# Altium schematic symbol library LDO.SchLib: 2675 symbols (part 23 of 31) (continued)
## LP3990SD-1.2
designator U?
150mA Linear Voltage Regulator for Digital Applications, 6-pin LLP; PartNumber: LP3990SD-1.2; Manufacturer: National Semiconductor; PackageTopMarking: ZXYTT*L086B; PowerWise: N; CompType: LDO IC; High-Reliability: Y; DatasheetVersion: Oct-2005; PackageVersion: revA, Jul-2003; PackageReference: SDE06A; PackageDescription: LLP, Plastic, Dual, 3 x 3 x 0.8mm Body, 6 Lead, 0.95mm Pitch, No Pullback; RoHS: N; PinCount: 6; ComponentLink1Description: Manufacturer URL; ComponentLink1URL: http://www.national.com/; ComponentLink2Description: LP3990 Datasheet; ComponentLink2URL: http://www.national.com/ds/LP/LP3990.pdf; ComponentLink3Description: LP3990 Web Page; ComponentLink3URL: http://www.national.com/pf/LP/LP3990.html; ComponentLink4Description: SDE06A Package Page; ComponentLink4URL: http://www.national.com/packaging/folders/sde06a.html
footprint SDE06A_full (SON, 6-Leads, Body 3x3 mm, Pitch 0.95mm, Full Paste, NSC Recommended)
footprint SDE06A_quad (SON, 6-Leads, Body 3x3 mm, Pitch 0.95mm, Quad Paste, NSC Recommended)
pins: 1 OUT (power), 2 GND (power), 3 NC, 4 NC, 5 EN (in), 6 IN (power), 7 DAP (power)

## LP3990SD-1.2/NOPB
designator U?
150mA Linear Voltage Regulator for Digital Applications, 6-pin LLP, Pb-Free; PartNumber: LP3990SD-1.2/NOPB; Manufacturer: National Semiconductor; PackageTopMarking: ZXYTT*L086B; PowerWise: N; CompType: LDO IC; High-Reliability: Y; DatasheetVersion: Oct-2005; PackageVersion: revA, Jul-2003; PackageReference: SDE06A; PackageDescription: LLP, Plastic, Dual, 3 x 3 x 0.8mm Body, 6 Lead, 0.95mm Pitch, No Pullback; RoHS: Y; PinCount: 6; ComponentLink1Description: Manufacturer URL; ComponentLink1URL: http://www.national.com/; ComponentLink2Description: LP3990 Datasheet; ComponentLink2URL: http://www.national.com/ds/LP/LP3990.pdf; ComponentLink3Description: LP3990 Web Page; ComponentLink3URL: http://www.national.com/pf/LP/LP3990.html; ComponentLink4Description: SDE06A Package Page; ComponentLink4URL: http://www.national.com/packaging/folders/sde06a.html
footprint SDE06A_full (SON, 6-Leads, Body 3x3 mm, Pitch 0.95mm, Full Paste, NSC Recommended)
footprint SDE06A_quad (SON, 6-Leads, Body 3x3 mm, Pitch 0.95mm, Quad Paste, NSC Recommended)
pins: 1 OUT (power), 2 GND (power), 3 NC, 4 NC, 5 EN (in), 6 IN (power), 7 DAP (power)

## LP3990SD-1.5
designator U?
150mA Linear Voltage Regulator for Digital Applications, 6-pin LLP; PartNumber: LP3990SD-1.5; Manufacturer: National Semiconductor; PackageTopMarking: ZXYTT*L087B; PowerWise: N; CompType: LDO IC; High-Reliability: Y; DatasheetVersion: Oct-2005; PackageVersion: revA, Jul-2003; PackageReference: SDE06A; PackageDescription: LLP, Plastic, Dual, 3 x 3 x 0.8mm Body, 6 Lead, 0.95mm Pitch, No Pullback; RoHS: N; PinCount: 6; ComponentLink1Description: Manufacturer URL; ComponentLink1URL: http://www.national.com/; ComponentLink2Description: LP3990 Datasheet; ComponentLink2URL: http://www.national.com/ds/LP/LP3990.pdf; ComponentLink3Description: LP3990 Web Page; ComponentLink3URL: http://www.national.com/pf/LP/LP3990.html; ComponentLink4Description: SDE06A Package Page; ComponentLink4URL: http://www.national.com/packaging/folders/sde06a.html
footprint SDE06A_full (SON, 6-Leads, Body 3x3 mm, Pitch 0.95mm, Full Paste, NSC Recommended)
footprint SDE06A_quad (SON, 6-Leads, Body 3x3 mm, Pitch 0.95mm, Quad Paste, NSC Recommended)
pins: 1 OUT (power), 2 GND (power), 3 NC, 4 NC, 5 EN (in), 6 IN (power), 7 DAP (power)

## LP3990SD-1.5/NOPB
designator U?
150mA Linear Voltage Regulator for Digital Applications, 6-pin LLP, Pb-Free; PartNumber: LP3990SD-1.5/NOPB; Manufacturer: National Semiconductor; PackageTopMarking: ZXYTT*L087B; PowerWise: N; CompType: LDO IC; High-Reliability: Y; DatasheetVersion: Oct-2005; PackageVersion: revA, Jul-2003; PackageReference: SDE06A; PackageDescription: LLP, Plastic, Dual, 3 x 3 x 0.8mm Body, 6 Lead, 0.95mm Pitch, No Pullback; RoHS: Y; PinCount: 6; ComponentLink1Description: Manufacturer URL; ComponentLink1URL: http://www.national.com/; ComponentLink2Description: LP3990 Datasheet; ComponentLink2URL: http://www.national.com/ds/LP/LP3990.pdf; ComponentLink3Description: LP3990 Web Page; ComponentLink3URL: http://www.national.com/pf/LP/LP3990.html; ComponentLink4Description: SDE06A Package Page; ComponentLink4URL: http://www.national.com/packaging/folders/sde06a.html
footprint SDE06A_full (SON, 6-Leads, Body 3x3 mm, Pitch 0.95mm, Full Paste, NSC Recommended)
footprint SDE06A_quad (SON, 6-Leads, Body 3x3 mm, Pitch 0.95mm, Quad Paste, NSC Recommended)
pins: 1 OUT (power), 2 GND (power), 3 NC, 4 NC, 5 EN (in), 6 IN (power), 7 DAP (power)

## LP3990SD-1.8
designator U?
150mA Linear Voltage Regulator for Digital Applications, 6-pin LLP; PartNumber: LP3990SD-1.8; Manufacturer: National Semiconductor; PackageTopMarking: ZXYTT*L088B; PowerWise: N; CompType: LDO IC; High-Reliability: Y; DatasheetVersion: Oct-2005; PackageVersion: revA, Jul-2003; PackageReference: SDE06A; PackageDescription: LLP, Plastic, Dual, 3 x 3 x 0.8mm Body, 6 Lead, 0.95mm Pitch, No Pullback; RoHS: N; PinCount: 6; ComponentLink1Description: Manufacturer URL; ComponentLink1URL: http://www.national.com/; ComponentLink2Description: LP3990 Datasheet; ComponentLink2URL: http://www.national.com/ds/LP/LP3990.pdf; ComponentLink3Description: LP3990 Web Page; ComponentLink3URL: http://www.national.com/pf/LP/LP3990.html; ComponentLink4Description: SDE06A Package Page; ComponentLink4URL: http://www.national.com/packaging/folders/sde06a.html
footprint SDE06A_full (SON, 6-Leads, Body 3x3 mm, Pitch 0.95mm, Full Paste, NSC Recommended)
footprint SDE06A_quad (SON, 6-Leads, Body 3x3 mm, Pitch 0.95mm, Quad Paste, NSC Recommended)
pins: 1 OUT (power), 2 GND (power), 3 NC, 4 NC, 5 EN (in), 6 IN (power), 7 DAP (power)

## LP3990SD-1.8/NOPB
designator U?
150mA Linear Voltage Regulator for Digital Applications, 6-pin LLP, Pb-Free; PartNumber: LP3990SD-1.8/NOPB; Manufacturer: National Semiconductor; PackageTopMarking: ZXYTT*L088B; PowerWise: N; CompType: LDO IC; High-Reliability: Y; DatasheetVersion: Oct-2005; PackageVersion: revA, Jul-2003; PackageReference: SDE06A; PackageDescription: LLP, Plastic, Dual, 3 x 3 x 0.8mm Body, 6 Lead, 0.95mm Pitch, No Pullback; RoHS: Y; PinCount: 6; ComponentLink1Description: Manufacturer URL; ComponentLink1URL: http://www.national.com/; ComponentLink2Description: LP3990 Datasheet; ComponentLink2URL: http://www.national.com/ds/LP/LP3990.pdf; ComponentLink3Description: LP3990 Web Page; ComponentLink3URL: http://www.national.com/pf/LP/LP3990.html; ComponentLink4Description: SDE06A Package Page; ComponentLink4URL: http://www.national.com/packaging/folders/sde06a.html
footprint SDE06A_full (SON, 6-Leads, Body 3x3 mm, Pitch 0.95mm, Full Paste, NSC Recommended)
footprint SDE06A_quad (SON, 6-Leads, Body 3x3 mm, Pitch 0.95mm, Quad Paste, NSC Recommended)
pins: 1 OUT (power), 2 GND (power), 3 NC, 4 NC, 5 EN (in), 6 IN (power), 7 DAP (power)

## LP3990TL-0.8/NOPB
designator U?
150mA Linear Voltage Regulator for Digital Applications, 4-pin Micro SMD, Pb-Free; PartNumber: LP3990TL-0.8/NOPB; Manufacturer: National Semiconductor; PackageTopMarking: X*I; PowerWise: N; CompType: LDO IC; High-Reliability: Y; DatasheetVersion: Oct-2005; PackageVersion: revD, Mar-2005; PackageReference: TLA04AMA; PackageDescription: Thin Micro SMD, 4 Bump (Large), 0.5mm Pitch; RoHS: Y; PinCount: 4; Code_JEDEC: MO-211-BA; ComponentLink1Description: Manufacturer URL; ComponentLink1URL: http://www.national.com/; ComponentLink2Description: LP3990 Datasheet; ComponentLink2URL: http://www.national.com/ds/LP/LP3990.pdf; ComponentLink3Description: LP3990 Web Page; ComponentLink3URL: http://www.national.com/pf/LP/LP3990.html; ComponentLink4Description: TLA04AMA Package Page; ComponentLink4URL: http://www.national.com/packaging/folders/tla04ama.html
footprint TLA04AMA (Micro SMD, 4-Leads, Body 1.29x1.01mm, Pitch 0.5mm, NSC Recommended)
pins: A1 GND (power), A2 EN (in), B1 OUT (power), B2 IN (power)

## LP3990TL-1.2/NOPB
designator U?
150mA Linear Voltage Regulator for Digital Applications, 4-pin Micro SMD, Pb-Free; PartNumber: LP3990TL-1.2/NOPB; Manufacturer: National Semiconductor; PackageTopMarking: X*I; PowerWise: N; CompType: LDO IC; High-Reliability: Y; DatasheetVersion: Oct-2005; PackageVersion: revD, Mar-2005; PackageReference: TLA04AMA; PackageDescription: Thin Micro SMD, 4 Bump (Large), 0.5mm Pitch; RoHS: Y; PinCount: 4; Code_JEDEC: MO-211-BA; ComponentLink1Description: Manufacturer URL; ComponentLink1URL: http://www.national.com/; ComponentLink2Description: LP3990 Datasheet; ComponentLink2URL: http://www.national.com/ds/LP/LP3990.pdf; ComponentLink3Description: LP3990 Web Page; ComponentLink3URL: http://www.national.com/pf/LP/LP3990.html; ComponentLink4Description: TLA04AMA Package Page; ComponentLink4URL: http://www.national.com/packaging/folders/tla04ama.html
footprint TLA04AMA (Micro SMD, 4-Leads, Body 1.29x1.01mm, Pitch 0.5mm, NSC Recommended)
pins: A1 GND (power), A2 EN (in), B1 OUT (power), B2 IN (power)

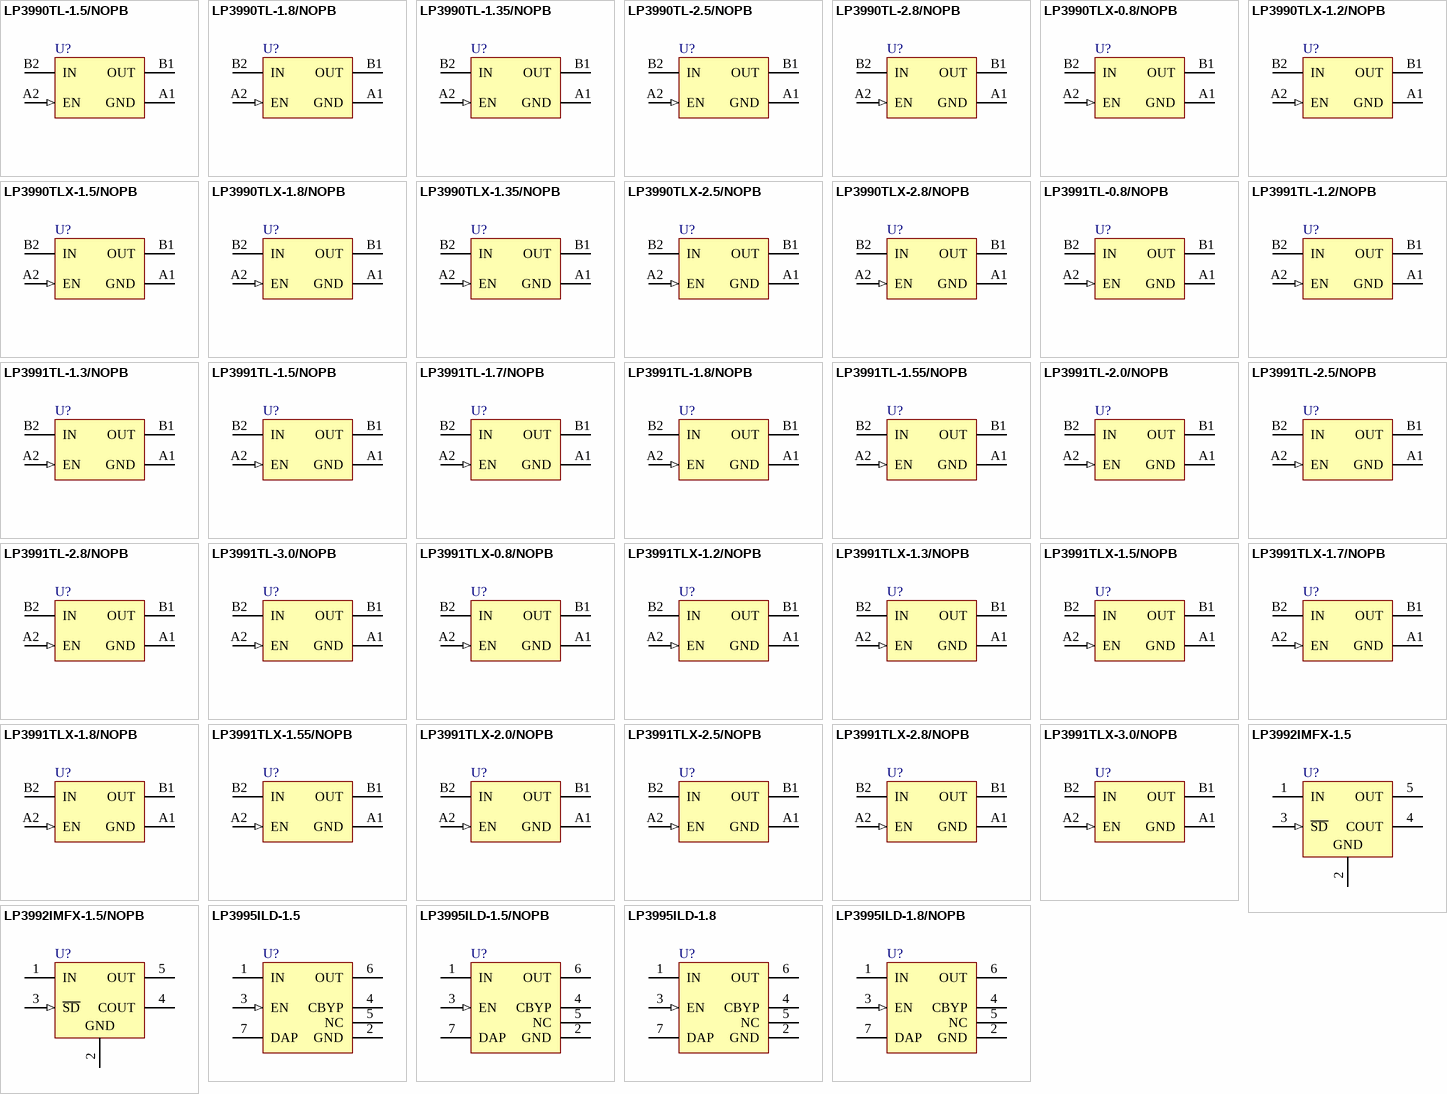
[diagram p49: symbols LP3990TL-1.5/NOPB to LP3995ILD-1.8/NOPB]

## LP3990TL-1.5/NOPB
designator U?
150mA Linear Voltage Regulator for Digital Applications, 4-pin Micro SMD, Pb-Free; PartNumber: LP3990TL-1.5/NOPB; Manufacturer: National Semiconductor; PackageTopMarking: X*I; PowerWise: N; CompType: LDO IC; High-Reliability: Y; DatasheetVersion: Oct-2005; PackageVersion: revD, Mar-2005; PackageReference: TLA04AMA; PackageDescription: Thin Micro SMD, 4 Bump (Large), 0.5mm Pitch; RoHS: Y; PinCount: 4; Code_JEDEC: MO-211-BA; ComponentLink1Description: Manufacturer URL; ComponentLink1URL: http://www.national.com/; ComponentLink2Description: LP3990 Datasheet; ComponentLink2URL: http://www.national.com/ds/LP/LP3990.pdf; ComponentLink3Description: LP3990 Web Page; ComponentLink3URL: http://www.national.com/pf/LP/LP3990.html; ComponentLink4Description: TLA04AMA Package Page; ComponentLink4URL: http://www.national.com/packaging/folders/tla04ama.html
footprint TLA04AMA (Micro SMD, 4-Leads, Body 1.29x1.01mm, Pitch 0.5mm, NSC Recommended)
pins: A1 GND (power), A2 EN (in), B1 OUT (power), B2 IN (power)

## LP3990TL-1.8/NOPB
designator U?
150mA Linear Voltage Regulator for Digital Applications, 4-pin Micro SMD, Pb-Free; PartNumber: LP3990TL-1.8/NOPB; Manufacturer: National Semiconductor; PackageTopMarking: X*I; PowerWise: N; CompType: LDO IC; High-Reliability: Y; DatasheetVersion: Oct-2005; PackageVersion: revD, Mar-2005; PackageReference: TLA04AMA; PackageDescription: Thin Micro SMD, 4 Bump (Large), 0.5mm Pitch; RoHS: Y; PinCount: 4; Code_JEDEC: MO-211-BA; ComponentLink1Description: Manufacturer URL; ComponentLink1URL: http://www.national.com/; ComponentLink2Description: LP3990 Datasheet; ComponentLink2URL: http://www.national.com/ds/LP/LP3990.pdf; ComponentLink3Description: LP3990 Web Page; ComponentLink3URL: http://www.national.com/pf/LP/LP3990.html; ComponentLink4Description: TLA04AMA Package Page; ComponentLink4URL: http://www.national.com/packaging/folders/tla04ama.html
footprint TLA04AMA (Micro SMD, 4-Leads, Body 1.29x1.01mm, Pitch 0.5mm, NSC Recommended)
pins: A1 GND (power), A2 EN (in), B1 OUT (power), B2 IN (power)

## LP3990TL-1.35/NOPB
designator U?
150mA Linear Voltage Regulator for Digital Applications, 4-pin Micro SMD, Pb-Free; PartNumber: LP3990TL-1.35/NOPB; Manufacturer: National Semiconductor; PackageTopMarking: X*I; PowerWise: N; CompType: LDO IC; High-Reliability: Y; DatasheetVersion: Oct-2005; PackageVersion: revD, Mar-2005; PackageReference: TLA04AMA; PackageDescription: Thin Micro SMD, 4 Bump (Large), 0.5mm Pitch; RoHS: Y; PinCount: 4; Code_JEDEC: MO-211-BA; ComponentLink1Description: Manufacturer URL; ComponentLink1URL: http://www.national.com/; ComponentLink2Description: LP3990 Datasheet; ComponentLink2URL: http://www.national.com/ds/LP/LP3990.pdf; ComponentLink3Description: LP3990 Web Page; ComponentLink3URL: http://www.national.com/pf/LP/LP3990.html; ComponentLink4Description: TLA04AMA Package Page; ComponentLink4URL: http://www.national.com/packaging/folders/tla04ama.html
footprint TLA04AMA (Micro SMD, 4-Leads, Body 1.29x1.01mm, Pitch 0.5mm, NSC Recommended)
pins: A1 GND (power), A2 EN (in), B1 OUT (power), B2 IN (power)

## LP3990TL-2.5/NOPB
designator U?
150mA Linear Voltage Regulator for Digital Applications, 4-pin Micro SMD, Pb-Free; PartNumber: LP3990TL-2.5/NOPB; Manufacturer: National Semiconductor; PackageTopMarking: X*I; PowerWise: N; CompType: LDO IC; High-Reliability: Y; DatasheetVersion: Oct-2005; PackageVersion: revD, Mar-2005; PackageReference: TLA04AMA; PackageDescription: Thin Micro SMD, 4 Bump (Large), 0.5mm Pitch; RoHS: Y; PinCount: 4; Code_JEDEC: MO-211-BA; ComponentLink1Description: Manufacturer URL; ComponentLink1URL: http://www.national.com/; ComponentLink2Description: LP3990 Datasheet; ComponentLink2URL: http://www.national.com/ds/LP/LP3990.pdf; ComponentLink3Description: LP3990 Web Page; ComponentLink3URL: http://www.national.com/pf/LP/LP3990.html; ComponentLink4Description: TLA04AMA Package Page; ComponentLink4URL: http://www.national.com/packaging/folders/tla04ama.html
footprint TLA04AMA (Micro SMD, 4-Leads, Body 1.29x1.01mm, Pitch 0.5mm, NSC Recommended)
pins: A1 GND (power), A2 EN (in), B1 OUT (power), B2 IN (power)

## LP3990TL-2.8/NOPB
designator U?
150mA Linear Voltage Regulator for Digital Applications, 4-pin Micro SMD, Pb-Free; PartNumber: LP3990TL-2.8/NOPB; Manufacturer: National Semiconductor; PackageTopMarking: X*I; PowerWise: N; CompType: LDO IC; High-Reliability: Y; DatasheetVersion: Oct-2005; PackageVersion: revD, Mar-2005; PackageReference: TLA04AMA; PackageDescription: Thin Micro SMD, 4 Bump (Large), 0.5mm Pitch; RoHS: Y; PinCount: 4; Code_JEDEC: MO-211-BA; ComponentLink1Description: Manufacturer URL; ComponentLink1URL: http://www.national.com/; ComponentLink2Description: LP3990 Datasheet; ComponentLink2URL: http://www.national.com/ds/LP/LP3990.pdf; ComponentLink3Description: LP3990 Web Page; ComponentLink3URL: http://www.national.com/pf/LP/LP3990.html; ComponentLink4Description: TLA04AMA Package Page; ComponentLink4URL: http://www.national.com/packaging/folders/tla04ama.html
footprint TLA04AMA (Micro SMD, 4-Leads, Body 1.29x1.01mm, Pitch 0.5mm, NSC Recommended)
pins: A1 GND (power), A2 EN (in), B1 OUT (power), B2 IN (power)

## LP3990TLX-0.8/NOPB
designator U?
150mA Linear Voltage Regulator for Digital Applications, 4-pin Micro SMD, Pb-Free; PartNumber: LP3990TLX-0.8/NOPB; Manufacturer: National Semiconductor; PackageTopMarking: X*I; PowerWise: N; CompType: LDO IC; High-Reliability: Y; DatasheetVersion: Oct-2005; PackageVersion: revD, Mar-2005; PackageReference: TLA04AMA; PackageDescription: Thin Micro SMD, 4 Bump (Large), 0.5mm Pitch; RoHS: Y; PinCount: 4; Code_JEDEC: MO-211-BA; ComponentLink1Description: Manufacturer URL; ComponentLink1URL: http://www.national.com/; ComponentLink2Description: LP3990 Datasheet; ComponentLink2URL: http://www.national.com/ds/LP/LP3990.pdf; ComponentLink3Description: LP3990 Web Page; ComponentLink3URL: http://www.national.com/pf/LP/LP3990.html; ComponentLink4Description: TLA04AMA Package Page; ComponentLink4URL: http://www.national.com/packaging/folders/tla04ama.html
footprint TLA04AMA (Micro SMD, 4-Leads, Body 1.29x1.01mm, Pitch 0.5mm, NSC Recommended)
pins: A1 GND (power), A2 EN (in), B1 OUT (power), B2 IN (power)

## LP3990TLX-1.2/NOPB
designator U?
150mA Linear Voltage Regulator for Digital Applications, 4-pin Micro SMD, Pb-Free; PartNumber: LP3990TLX-1.2/NOPB; Manufacturer: National Semiconductor; PackageTopMarking: X*I; PowerWise: N; CompType: LDO IC; High-Reliability: Y; DatasheetVersion: Oct-2005; PackageVersion: revD, Mar-2005; PackageReference: TLA04AMA; PackageDescription: Thin Micro SMD, 4 Bump (Large), 0.5mm Pitch; RoHS: Y; PinCount: 4; Code_JEDEC: MO-211-BA; ComponentLink1Description: Manufacturer URL; ComponentLink1URL: http://www.national.com/; ComponentLink2Description: LP3990 Datasheet; ComponentLink2URL: http://www.national.com/ds/LP/LP3990.pdf; ComponentLink3Description: LP3990 Web Page; ComponentLink3URL: http://www.national.com/pf/LP/LP3990.html; ComponentLink4Description: TLA04AMA Package Page; ComponentLink4URL: http://www.national.com/packaging/folders/tla04ama.html
footprint TLA04AMA (Micro SMD, 4-Leads, Body 1.29x1.01mm, Pitch 0.5mm, NSC Recommended)
pins: A1 GND (power), A2 EN (in), B1 OUT (power), B2 IN (power)

## LP3990TLX-1.5/NOPB
designator U?
150mA Linear Voltage Regulator for Digital Applications, 4-pin Micro SMD, Pb-Free; PartNumber: LP3990TLX-1.5/NOPB; Manufacturer: National Semiconductor; PackageTopMarking: X*I; PowerWise: N; CompType: LDO IC; High-Reliability: Y; DatasheetVersion: Oct-2005; PackageVersion: revD, Mar-2005; PackageReference: TLA04AMA; PackageDescription: Thin Micro SMD, 4 Bump (Large), 0.5mm Pitch; RoHS: Y; PinCount: 4; Code_JEDEC: MO-211-BA; ComponentLink1Description: Manufacturer URL; ComponentLink1URL: http://www.national.com/; ComponentLink2Description: LP3990 Datasheet; ComponentLink2URL: http://www.national.com/ds/LP/LP3990.pdf; ComponentLink3Description: LP3990 Web Page; ComponentLink3URL: http://www.national.com/pf/LP/LP3990.html; ComponentLink4Description: TLA04AMA Package Page; ComponentLink4URL: http://www.national.com/packaging/folders/tla04ama.html
footprint TLA04AMA (Micro SMD, 4-Leads, Body 1.29x1.01mm, Pitch 0.5mm, NSC Recommended)
pins: A1 GND (power), A2 EN (in), B1 OUT (power), B2 IN (power)

## LP3990TLX-1.8/NOPB
designator U?
150mA Linear Voltage Regulator for Digital Applications, 4-pin Micro SMD, Pb-Free; PartNumber: LP3990TLX-1.8/NOPB; Manufacturer: National Semiconductor; PackageTopMarking: X*I; PowerWise: N; CompType: LDO IC; High-Reliability: Y; DatasheetVersion: Oct-2005; PackageVersion: revD, Mar-2005; PackageReference: TLA04AMA; PackageDescription: Thin Micro SMD, 4 Bump (Large), 0.5mm Pitch; RoHS: Y; PinCount: 4; Code_JEDEC: MO-211-BA; ComponentLink1Description: Manufacturer URL; ComponentLink1URL: http://www.national.com/; ComponentLink2Description: LP3990 Datasheet; ComponentLink2URL: http://www.national.com/ds/LP/LP3990.pdf; ComponentLink3Description: LP3990 Web Page; ComponentLink3URL: http://www.national.com/pf/LP/LP3990.html; ComponentLink4Description: TLA04AMA Package Page; ComponentLink4URL: http://www.national.com/packaging/folders/tla04ama.html
footprint TLA04AMA (Micro SMD, 4-Leads, Body 1.29x1.01mm, Pitch 0.5mm, NSC Recommended)
pins: A1 GND (power), A2 EN (in), B1 OUT (power), B2 IN (power)

## LP3990TLX-1.35/NOPB
designator U?
150mA Linear Voltage Regulator for Digital Applications, 4-pin Micro SMD, Pb-Free; PartNumber: LP3990TLX-1.35/NOPB; Manufacturer: National Semiconductor; PackageTopMarking: X*I; PowerWise: N; CompType: LDO IC; High-Reliability: Y; DatasheetVersion: Oct-2005; PackageVersion: revD, Mar-2005; PackageReference: TLA04AMA; PackageDescription: Thin Micro SMD, 4 Bump (Large), 0.5mm Pitch; RoHS: Y; PinCount: 4; Code_JEDEC: MO-211-BA; ComponentLink1Description: Manufacturer URL; ComponentLink1URL: http://www.national.com/; ComponentLink2Description: LP3990 Datasheet; ComponentLink2URL: http://www.national.com/ds/LP/LP3990.pdf; ComponentLink3Description: LP3990 Web Page; ComponentLink3URL: http://www.national.com/pf/LP/LP3990.html; ComponentLink4Description: TLA04AMA Package Page; ComponentLink4URL: http://www.national.com/packaging/folders/tla04ama.html
footprint TLA04AMA (Micro SMD, 4-Leads, Body 1.29x1.01mm, Pitch 0.5mm, NSC Recommended)
pins: A1 GND (power), A2 EN (in), B1 OUT (power), B2 IN (power)

## LP3990TLX-2.5/NOPB
designator U?
150mA Linear Voltage Regulator for Digital Applications, 4-pin Micro SMD, Pb-Free; PartNumber: LP3990TLX-2.5/NOPB; Manufacturer: National Semiconductor; PackageTopMarking: X*I; PowerWise: N; CompType: LDO IC; High-Reliability: Y; DatasheetVersion: Oct-2005; PackageVersion: revD, Mar-2005; PackageReference: TLA04AMA; PackageDescription: Thin Micro SMD, 4 Bump (Large), 0.5mm Pitch; RoHS: Y; PinCount: 4; Code_JEDEC: MO-211-BA; ComponentLink1Description: Manufacturer URL; ComponentLink1URL: http://www.national.com/; ComponentLink2Description: LP3990 Datasheet; ComponentLink2URL: http://www.national.com/ds/LP/LP3990.pdf; ComponentLink3Description: LP3990 Web Page; ComponentLink3URL: http://www.national.com/pf/LP/LP3990.html; ComponentLink4Description: TLA04AMA Package Page; ComponentLink4URL: http://www.national.com/packaging/folders/tla04ama.html
footprint TLA04AMA (Micro SMD, 4-Leads, Body 1.29x1.01mm, Pitch 0.5mm, NSC Recommended)
pins: A1 GND (power), A2 EN (in), B1 OUT (power), B2 IN (power)

## LP3990TLX-2.8/NOPB
designator U?
150mA Linear Voltage Regulator for Digital Applications, 4-pin Micro SMD, Pb-Free; PartNumber: LP3990TLX-2.8/NOPB; Manufacturer: National Semiconductor; PackageTopMarking: X*I; PowerWise: N; CompType: LDO IC; High-Reliability: Y; DatasheetVersion: Oct-2005; PackageVersion: revD, Mar-2005; PackageReference: TLA04AMA; PackageDescription: Thin Micro SMD, 4 Bump (Large), 0.5mm Pitch; RoHS: Y; PinCount: 4; Code_JEDEC: MO-211-BA; ComponentLink1Description: Manufacturer URL; ComponentLink1URL: http://www.national.com/; ComponentLink2Description: LP3990 Datasheet; ComponentLink2URL: http://www.national.com/ds/LP/LP3990.pdf; ComponentLink3Description: LP3990 Web Page; ComponentLink3URL: http://www.national.com/pf/LP/LP3990.html; ComponentLink4Description: TLA04AMA Package Page; ComponentLink4URL: http://www.national.com/packaging/folders/tla04ama.html
footprint TLA04AMA (Micro SMD, 4-Leads, Body 1.29x1.01mm, Pitch 0.5mm, NSC Recommended)
pins: A1 GND (power), A2 EN (in), B1 OUT (power), B2 IN (power)

## LP3991TL-0.8/NOPB
designator U?
300mA Linear Voltage Regulator for Digital Applications, 4-pin Micro SMD, Pb-Free; PartNumber: LP3991TL-0.8/NOPB; Manufacturer: National Semiconductor; PackageTopMarking: X*I; PowerWise: N; CompType: LDO IC; High-Reliability: Y; DatasheetVersion: Sep-2008; PackageVersion: revD, Mar-2005; PackageReference: TLA04ZTA; PackageDescription: Thin Micro SMD, 4 Bump (Large), 0.5mm Pitch; RoHS: Y; PinCount: 4; Code_JEDEC: MO-211-BA; ComponentLink1Description: Manufacturer URL; ComponentLink1URL: http://www.national.com/; ComponentLink2Description: LP3991 Datasheet; ComponentLink2URL: http://www.national.com/ds/LP/LP3991.pdf; ComponentLink3Description: LP3991 Web Page; ComponentLink3URL: http://www.national.com/pf/LP/LP3991.html; ComponentLink4Description: TLA04ZTA Package Page; ComponentLink4URL: http://www.national.com/packaging/folders/tla04zta.html
footprint TLA04ZTA (Micro SMD, 4-Leads, Body 1.45x0.96mm, Pitch 0.5mm, NSC Recommended)
pins: A1 GND (power), A2 EN (in), B1 OUT (power), B2 IN (power)

## LP3991TL-1.2/NOPB
designator U?
300mA Linear Voltage Regulator for Digital Applications, 4-pin Micro SMD, Pb-Free; PartNumber: LP3991TL-1.2/NOPB; Manufacturer: National Semiconductor; PackageTopMarking: X*I; PowerWise: Y; CompType: LDO IC; DatasheetVersion: Sep-2008; PackageVersion: revD, Mar-2005; PackageReference: TLA04ZTA; PackageDescription: Thin Micro SMD, 4 Bump (Large), 0.5mm Pitch; RoHS: Y; PinCount: 4; High-Reliability: Y; Code_JEDEC: MO-211-BA; ComponentLink1Description: Manufacturer URL; ComponentLink1URL: http://www.national.com/; ComponentLink2Description: LP3991 Datasheet; ComponentLink2URL: http://www.national.com/ds/LP/LP3991.pdf; ComponentLink3Description: LP3991 Web Page; ComponentLink3URL: http://www.national.com/pf/LP/LP3991.html; ComponentLink4Description: TLA04ZTA Package Page; ComponentLink4URL: http://www.national.com/packaging/folders/tla04zta.html
footprint TLA04ZTA (Micro SMD, 4-Leads, Body 1.45x0.96mm, Pitch 0.5mm, NSC Recommended)
pins: A1 GND (power), A2 EN (in), B1 OUT (power), B2 IN (power)

## LP3991TL-1.3/NOPB
designator U?
300mA Linear Voltage Regulator for Digital Applications, 4-pin Micro SMD, Pb-Free; PartNumber: LP3991TL-1.3/NOPB; Manufacturer: National Semiconductor; PackageTopMarking: X*I; PowerWise: Y; CompType: LDO IC; DatasheetVersion: Sep-2008; PackageVersion: revD, Mar-2005; PackageReference: TLA04ZTA; PackageDescription: Thin Micro SMD, 4 Bump (Large), 0.5mm Pitch; RoHS: Y; PinCount: 4; High-Reliability: Y; Code_JEDEC: MO-211-BA; ComponentLink1Description: Manufacturer URL; ComponentLink1URL: http://www.national.com/; ComponentLink2Description: LP3991 Datasheet; ComponentLink2URL: http://www.national.com/ds/LP/LP3991.pdf; ComponentLink3Description: LP3991 Web Page; ComponentLink3URL: http://www.national.com/pf/LP/LP3991.html; ComponentLink4Description: TLA04ZTA Package Page; ComponentLink4URL: http://www.national.com/packaging/folders/tla04zta.html
footprint TLA04ZTA (Micro SMD, 4-Leads, Body 1.45x0.96mm, Pitch 0.5mm, NSC Recommended)
pins: A1 GND (power), A2 EN (in), B1 OUT (power), B2 IN (power)

## LP3991TL-1.5/NOPB
designator U?
300mA Linear Voltage Regulator for Digital Applications, 4-pin Micro SMD, Pb-Free; PartNumber: LP3991TL-1.5/NOPB; Manufacturer: National Semiconductor; PackageTopMarking: X*I; PowerWise: Y; CompType: LDO IC; DatasheetVersion: Sep-2008; PackageVersion: revD, Mar-2005; PackageReference: TLA04ZTA; PackageDescription: Thin Micro SMD, 4 Bump (Large), 0.5mm Pitch; RoHS: Y; PinCount: 4; High-Reliability: Y; Code_JEDEC: MO-211-BA; ComponentLink1Description: Manufacturer URL; ComponentLink1URL: http://www.national.com/; ComponentLink2Description: LP3991 Datasheet; ComponentLink2URL: http://www.national.com/ds/LP/LP3991.pdf; ComponentLink3Description: LP3991 Web Page; ComponentLink3URL: http://www.national.com/pf/LP/LP3991.html; ComponentLink4Description: TLA04ZTA Package Page; ComponentLink4URL: http://www.national.com/packaging/folders/tla04zta.html
footprint TLA04ZTA (Micro SMD, 4-Leads, Body 1.45x0.96mm, Pitch 0.5mm, NSC Recommended)
pins: A1 GND (power), A2 EN (in), B1 OUT (power), B2 IN (power)

## LP3991TL-1.7/NOPB
designator U?
300mA Linear Voltage Regulator for Digital Applications, 4-pin Micro SMD, Pb-Free; PartNumber: LP3991TL-1.7/NOPB; Manufacturer: National Semiconductor; PackageTopMarking: X*I; PowerWise: N; CompType: LDO IC; High-Reliability: Y; DatasheetVersion: Sep-2008; PackageVersion: revD, Mar-2005; PackageReference: TLA04ZTA; PackageDescription: Thin Micro SMD, 4 Bump (Large), 0.5mm Pitch; RoHS: Y; PinCount: 4; Code_JEDEC: MO-211-BA; ComponentLink1Description: Manufacturer URL; ComponentLink1URL: http://www.national.com/; ComponentLink2Description: LP3991 Datasheet; ComponentLink2URL: http://www.national.com/ds/LP/LP3991.pdf; ComponentLink3Description: LP3991 Web Page; ComponentLink3URL: http://www.national.com/pf/LP/LP3991.html; ComponentLink4Description: TLA04ZTA Package Page; ComponentLink4URL: http://www.national.com/packaging/folders/tla04zta.html
footprint TLA04ZTA (Micro SMD, 4-Leads, Body 1.45x0.96mm, Pitch 0.5mm, NSC Recommended)
pins: A1 GND (power), A2 EN (in), B1 OUT (power), B2 IN (power)
